# Altium footprint library ECU_AutoRC_r00.PcbLib: 62 footprints (part 1 of 4)
Each footprint in its own frame and in the unit in brackets; x right, y up, seen from the top. Pads: shape width x height; smd on the part's side, far side on the other; paste and mask are expansions set on the pad; w line width, h text height; cw(c..) or ccw(c..) is an arc to the next point about the centre after c.
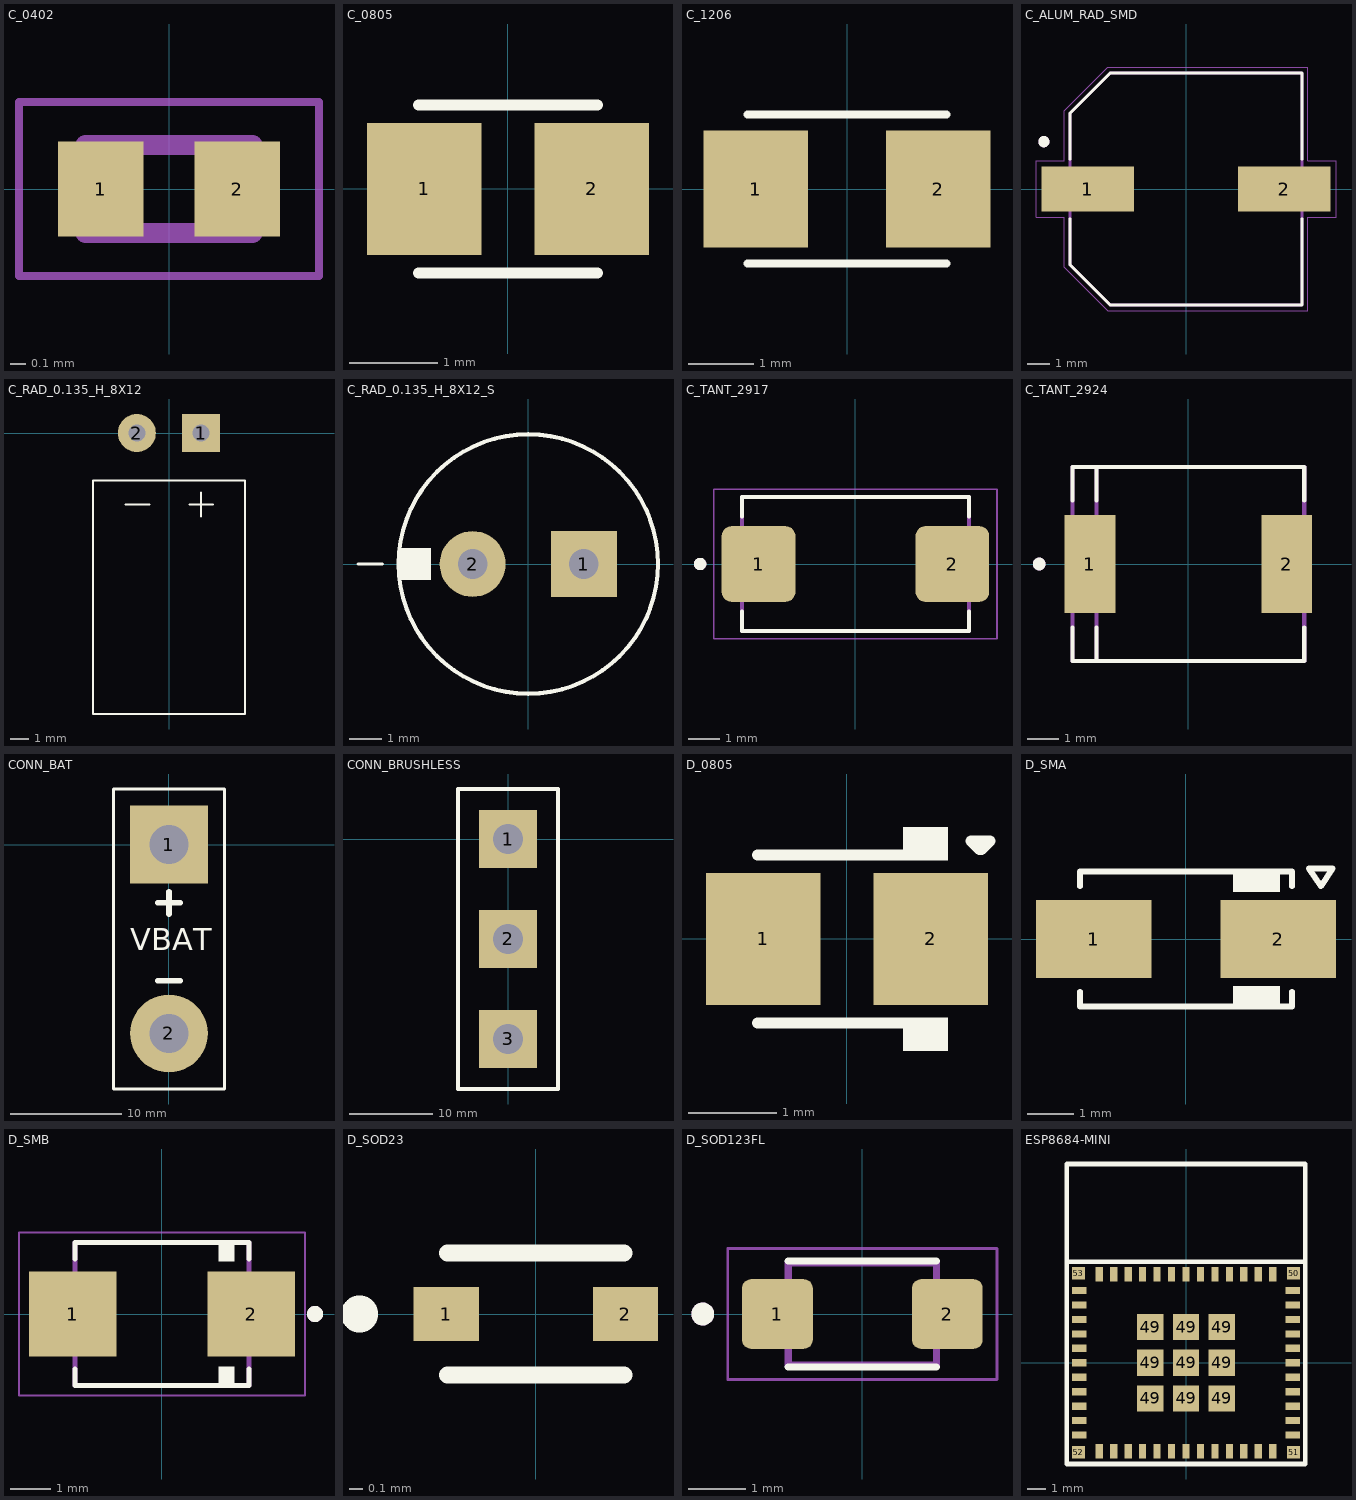
[diagram p0: the footprints below, top view; thin cyan lines are the x and y axes]

## C_0402 [mm]
pads (2):
  rect 0.54x0.6 smd: 1(-0.432,0) 2(0.432,0)
Mechanical 13:
  lines w0.127: -0.53,-0.28 0.53,-0.28 0.53,0.28 -0.53,0.28 -0.53,-0.28
Mechanical 15:
  lines w0.05: -0.95,-0.55 0.95,-0.55 0.95,0.55 -0.95,0.55 -0.95,-0.55
3D body "step_temp.STEP": height 0.55, standoff 0, extent -0.5,-0.25 0.5,0.25

## C_0805 [mm] "Chip Capacitor, 2-Leads, Body 2.00x1.25mm"
height 1.1
pads (2):
  rect 1.3x1.5 smd: 1(-0.95,0) 2(0.95,0)
Top Overlay:
  lines w0.127: -1.016,-0.953 1.016,-0.953 ; -1.016,0.953 1.016,0.953
3D body "SW3dPS-0805 SMD Capacitor.STEP": height 0.78, standoff 0, extent -1,-0.625 1,0.625

## C_1206 [mm]
pads (2):
  rect 1.6x1.8 smd: 1(-1.4,0) 2(1.4,0)
Top Overlay:
  lines w0.127: -1.524,-1.143 1.524,-1.143 ; -1.524,1.143 1.524,1.143
3D body "SW3dPS-1206 SMD Capacitor.STEP": height 1, standoff 0, extent -1.6,-0.8 1.6,0.8

## C_ALUM_RAD_SMD [mm]
pads (2):
  rect 4.1x2 smd: 1(-4.35,0) 2(4.35,0)
Top Overlay:
  circle w0.3: c-6.3,2.1 r0.1
  lines w0.127: -5.15,-1.32 -5.15,-3.35 -3.35,-5.15 5.15,-5.15 5.15,-1.32 ; -5.15,1.32 -5.15,3.35 -3.35,5.15 5.15,5.15 5.15,1.32
Mechanical 13:
  circle w0.3: c-6.3,2.1 r0.1
  lines w0.127: -5.15,-3.35 -5.15,3.35 -3.35,5.15 5.15,5.15 5.15,-5.15 -3.35,-5.15 -5.15,-3.35
Mechanical 15:
  lines w0.05: -6.65,-1.25 -5.4,-1.25 -5.4,-3.475 -3.475,-5.4 5.4,-5.4 5.4,-1.25 6.65,-1.25 6.65,1.25 5.4,1.25 5.4,5.4 -3.475,5.4 -5.4,3.475 -5.4,1.25 -6.65,1.25 -6.65,-1.25
3D body "step_temp.STEP": height 9.3, standoff -0.9, extent -5.85,-5.15 5.85,5.15

## C_RAD_0.135_H_8X12 [mil]
pads (2):
  rect 80x80 hole 36: 1(67.5,0)
  round 80 hole 36: 2(-67.5,0)
Top Overlay:
  lines w4: -91.12,-150 -41.12,-150 ; 42.5,-150 92.5,-150 ; 67.5,-175 67.5,-125 ; -160,-590.12 -160,-100 160,-100 160,-590.12 -160,-590.12
3D body "User Library-Cap electrolitic radial 8x12.STEP": height 334.58, standoff 19.69, extent -157.42,-590.55 157.43,-59.06

## C_RAD_0.135_H_8X12_S [mil]
pads (2):
  rect 80x80 hole 36: 1(67.5,0)
  round 80 hole 36: 2(-67.5,0)
Top Overlay:
  circle w5: c0,0 r157.48
  rectangle: -157.48,-19.68 -118.11,19.69
  lines w4: -206.69,0 -177.17,0
3D body "User Library-Cap-EL(8x12-3_5)T.STEP": height 484.33, standoff -129.92, extent -157.56,-157.41 157.48,157.4

## C_TANT_2917 [mm]
height 4.3
pads (2):
  rrect25% 2.37x2.43 smd: 1(-3.12,0) 2(3.12,0)
Top Overlay:
  circle w0.2: c-5,0 r0.1
  lines w0.127: -3.65,-1.535 -3.65,-2.15 3.65,-2.15 3.65,-1.535 ; -3.65,1.535 -3.65,2.15 3.65,2.15 3.65,1.535
Mechanical 13:
  circle w0.2: c-5,0 r0.1
  lines w0.127: -3.65,-2.15 -3.65,2.15 3.65,2.15 3.65,-2.15 -3.65,-2.15
Mechanical 15:
  lines w0.05: -4.555,-2.4 -4.555,2.4 4.555,2.4 4.555,-2.4 -4.555,-2.4
3D body "T491X226K050ATAUTO.STEP": height 4.3, standoff 0, extent -3.65,-2.15 3.65,2.15

## C_TANT_2924 [mm]
pads (2):
  rect 1.6x3.1 smd: 1(-3.1,0) 2(3.1,0)
Top Overlay:
  circle w0.2: c-4.7,0 r0.1
  lines w0.127: -3.65,-2 -3.65,-3.05 3.65,-3.05 3.65,-2 ; -3.65,2 -3.65,3.05 3.65,3.05 3.65,2 ; -2.9,-3.05 -2.9,-2 ; -2.9,2 -2.9,3.05
Mechanical 13:
  circle w0.2: c-4.7,0 r0.1
  lines w0.127: -2.9,-3.05 -2.9,3.05 ; -3.65,-3.05 3.65,-3.05 3.65,3.05 -3.65,3.05 -3.65,-3.05
3D body "TAJV226K050RNJ.STEP": height 3.75, standoff 0, extent -3.65,-3.05 3.65,3.05

## CONN_BAT [mm]
pads (2):
  rect 7x7 hole 3.5: 1(0,0)
  round 7 hole 3.5: 2(0,-17)
Top Overlay:
  lines w0.254: -5,-22 5,-22 5,5 -5,5 -5,-22
  lines w0.5: -1,-12.25 1,-12.25 ; -1,-5.25 1,-5.25 ; 0,-6.25 0,-4.25
  text "VBAT" at -3.5,-9.5 h2

## CONN_BRUSHLESS [mm]
pads (3):
  rect 7x7 hole 3.6: 1(0,0) 2(0,-12) 3(0,-24)
Top Overlay:
  lines w0.5: -6,-30 6,-30 6,6 -6,6 -6,-30

## D_0805 [mm]
pads (2):
  rect 1.3x1.5 smd: 1(-0.95,0) 2(0.95,0)
Top Overlay:
  rectangle: 0.635,0.889 1.143,1.27
  rectangle: 0.635,-1.27 1.143,-0.889
  lines w0.127: -1.016,-0.953 1.016,-0.953 ; -1.016,0.953 1.016,0.953 ; 1.405,1.111 1.5,1.016 1.524,1.016 1.619,1.111 1.405,1.111
3D body "User Library-User Library-led_0805 YEL.STEP": height 1.12, standoff -0.02, extent -1.01,-0.663 1.01,0.625

## D_SMA [mm]
height 2.4
pads (2):
  rect 2.5x1.7 smd: 1(-2,0) 2(2,0)
Top Overlay:
  rectangle: 1.016,1.016 2.032,1.524
  rectangle: 1.016,-1.524 2.032,-1.016
  lines w0.127: -2.3,-1.143 -2.3,-1.46 2.3,-1.46 2.3,-1.143 ; -2.3,1.143 -2.3,1.46 2.3,1.46 2.3,1.143 ; 2.667,1.524 3.175,1.524 2.921,1.143 2.667,1.524
3D body "User Library-DO-214AC(SMA).STEP": height 2.39, standoff 0.11, extent -2.743,-1.397 2.743,1.397

## D_SMB [mm]
height 2.47
pads (2):
  rect 2.17x2.11 smd: 1(-2.22,0) 2(2.22,0)
Top Overlay:
  circle w0.2: c3.805,0 r0.1
  rectangle: 1.4,-1.8 1.8,-1.3
  rectangle: 1.4,1.3 1.8,1.8
  lines w0.127: -2.16,-1.375 -2.16,-1.78 2.16,-1.78 2.16,-1.375 ; -2.16,1.375 -2.16,1.78 2.16,1.78 2.16,1.375
Mechanical 13:
  circle w0.2: c3.805,0 r0.1
  lines w0.127: -2.16,-1.78 2.16,-1.78 2.16,1.78 -2.16,1.78 -2.16,-1.78
Mechanical 15:
  lines w0.05: -3.555,-2.03 3.555,-2.03 3.555,2.03 -3.555,2.03 -3.555,-2.03
3D body "step_temp.STEP": height 2.49, standoff 0.02, extent -2.72,-1.78 2.72,1.78

## D_SOD23 [mm]
pads (2):
  rect 0.48x0.4 smd: 1(-0.66,0) 2(0.66,0)
Top Overlay:
  circle w0.254: c-1.3,0 r0.01
  lines w0.127: -0.65,-0.45 0.65,-0.45 ; -0.65,0.45 0.65,0.45
3D body "ESD5Z12T1G.STEP": height 0.7, standoff 0, extent -0.8,-0.4 0.8,0.4

## D_SOD123FL [mm]
pads (2):
  rrect25% 1.24x1.22 smd: 1(-1.49,0) 2(1.49,0)
Top Overlay:
  circle w0.2: c-2.8,0 r0.1
  lines w0.127: -1.3,-0.93 1.3,-0.93 ; -1.3,0.93 1.3,0.93
Mechanical 13:
  circle w0.2: c-2.8,0 r0.1
  lines w0.127: -1.3,-0.9 1.3,-0.9 1.3,0.9 -1.3,0.9 -1.3,-0.9
Mechanical 15:
  lines w0.05: -2.36,-1.15 2.36,-1.15 2.36,1.15 -2.36,1.15 -2.36,-1.15
3D body "DSS15UTR.STEP": height 1.1, standoff 0, extent -1.8,-0.9 1.8,0.9

## ESP8684-MINI [mm]
pads (61):
  rect 0.8x0.4 smd: 1(-5.9,4) 2(-5.9,3.2) 3(-5.9,2.4) 4(-5.9,1.6) 5(-5.9,0.8) 6(-5.9,0) 7(-5.9,-0.8) 8(-5.9,-1.6) 9(-5.9,-2.4) 10(-5.9,-3.2) 11(-5.9,-4) 25(5.9,-4) 26(5.9,-3.2) 27(5.9,-2.4) 28(5.9,-1.6) 29(5.9,-0.8) 30(5.9,0) 31(5.9,0.8) 32(5.9,1.6) 33(5.9,2.4) 34(5.9,3.2) 35(5.9,4)
  rect 0.4x0.8 smd: 12(-4.8,-4.9) 13(-4,-4.9) 14(-3.2,-4.9) 15(-2.4,-4.9) 16(-1.6,-4.9) 17(-0.8,-4.9) 18(0,-4.9) 19(0.8,-4.9) 20(1.6,-4.9) 21(2.4,-4.9) 22(3.2,-4.9) 23(4,-4.9) 24(4.8,-4.9) 36(4.8,4.9) 37(4,4.9) 38(3.2,4.9) 39(2.4,4.9) 40(1.6,4.9) 41(0.8,4.9) 42(0,4.9) 43(-0.8,4.9) 44(-1.6,4.9) 45(-2.4,4.9) 46(-3.2,4.9) 47(-4,4.9) 48(-4.8,4.9)
  rect 1.45x1.45 smd: 49(-1.975,-1.975) 49(-1.975,0) 49(-1.975,1.975) 49(0,-1.975) 49(0,0) 49(0,1.975) 49(1.975,-1.975) 49(1.975,0) 49(1.975,1.975)
  rect 0.7x0.7 smd: 50(5.95,4.95) 51(5.95,-4.95) 52(-5.95,-4.95) 53(-5.95,4.95)
Top Overlay:
  lines w0.254: -6.6,-5.6 6.6,-5.6 ; -6.6,-5.6 -6.6,11 6.6,11 6.6,-5.6 ; -6.6,-5.6 6.6,-5.6 ; -6.6,-5.6 -6.6,5.6 6.6,5.6 6.6,-5.6
Mechanical 15:
  text "Antenna Area" at -4.1,8.116 h1.52
3D body "ESP8684-MINI-1-H2.STEP": height 2.55, standoff 0, extent -6.6,-5.6 6.6,11